# Altium integrated library Samtec 2 mm Pitch Terminal Strips.IntLib: 623 symbols (part 5 of 5) (continued)
## TW-36-02-F-D-190-SM-A (continued)
SMT Board Stacker, Vertical, -55 to 125 degC, 2 mm Pitch, 72-Pin, Male, RoHS; Manufacturer: Samtec; PartNumber: TW-36-02-F-D-190-SM-A; Pitch: 2 mm; DatasheetVersion: F-214; PackageVersion: CL, 3/1993; PackageReference: TW-36-02-X-D-190-SM-A; PackageDescription: High Temp 2mm SMT Board Stacking Terminal Strip ASM; Orientation: Vertical; RoHS: True; Temperature Range: -55 to 125 degC; Mounting Technology: Surface Mount; ComponentLink1Description: Manufacturer URL; ComponentLink1URL: http://www.samtec.com; ComponentLink2Description: Datasheet; ComponentLink2URL: http://d2a072wq521u33.cloudfront.net/catalog_english//TW_SM.PDF; ComponentLink3Description: Package Specification; ComponentLink3URL: http://www.samtec.com/documents/webfiles/cpdf/TW-XX-XX-XXX-X-XXX-SM-XXX-XX-MKT1.pdf
footprint SMTC-TW-36-02-X-D-190-SM-A (SMT Board Stacking Terminal Strip ASM, 2x36 Pins, Vertical, 2mm Pitch, Male)
pins: 1, 2, 3, 4, 5, 6, 7, 8, 9, 10, 11, 12, 13, 14, 15, 16, 17, 18, 19, 20, 21, 22, 23, 24, 25, 26, 27, 28, 29, 30, 31, 32, 33, 34, 35, 36, 37, 38, 39, 40, 41, 42, 43, 44, 45, 46, 47, 48, 49, 50, 51, 52, 53, 54, 55, 56, 57, 58, 59, 60, 61, 62, 63, 64, 65, 66, 67, 68, 69, 70, 71, 72

## TW-36-02-L-D-190-SM-A
designator ?
SMT Board Stacker, Vertical, -55 to 125 degC, 2 mm Pitch, 72-Pin, Male, RoHS; Manufacturer: Samtec; PartNumber: TW-36-02-L-D-190-SM-A; Pitch: 2 mm; DatasheetVersion: F-214; PackageVersion: CL, 3/1993; PackageReference: TW-36-02-X-D-190-SM-A; PackageDescription: High Temp 2mm SMT Board Stacking Terminal Strip ASM; Orientation: Vertical; RoHS: True; Temperature Range: -55 to 125 degC; Mounting Technology: Surface Mount; ComponentLink1Description: Manufacturer URL; ComponentLink1URL: http://www.samtec.com; ComponentLink2Description: Datasheet; ComponentLink2URL: http://d2a072wq521u33.cloudfront.net/catalog_english//TW_SM.PDF; ComponentLink3Description: Package Specification; ComponentLink3URL: http://www.samtec.com/documents/webfiles/cpdf/TW-XX-XX-XXX-X-XXX-SM-XXX-XX-MKT1.pdf
footprint SMTC-TW-36-02-X-D-190-SM-A (SMT Board Stacking Terminal Strip ASM, 2x36 Pins, Vertical, 2mm Pitch, Male)
pins: 1, 2, 3, 4, 5, 6, 7, 8, 9, 10, 11, 12, 13, 14, 15, 16, 17, 18, 19, 20, 21, 22, 23, 24, 25, 26, 27, 28, 29, 30, 31, 32, 33, 34, 35, 36, 37, 38, 39, 40, 41, 42, 43, 44, 45, 46, 47, 48, 49, 50, 51, 52, 53, 54, 55, 56, 57, 58, 59, 60, 61, 62, 63, 64, 65, 66, 67, 68, 69, 70, 71, 72

## TW-36-02-T-D-190-SM-A
designator ?
SMT Board Stacker, Vertical, -55 to 105 degC, 2 mm Pitch, 72-Pin, Male, RoHS; Manufacturer: Samtec; PartNumber: TW-36-02-T-D-190-SM-A; Pitch: 2 mm; DatasheetVersion: F-214; PackageVersion: CL, 3/1993; PackageReference: TW-36-02-X-D-190-SM-A; PackageDescription: High Temp 2mm SMT Board Stacking Terminal Strip ASM; Orientation: Vertical; RoHS: True; Temperature Range: -55 to 105 degC; Mounting Technology: Surface Mount; ComponentLink1Description: Manufacturer URL; ComponentLink1URL: http://www.samtec.com; ComponentLink2Description: Datasheet; ComponentLink2URL: http://d2a072wq521u33.cloudfront.net/catalog_english//TW_SM.PDF; ComponentLink3Description: Package Specification; ComponentLink3URL: http://www.samtec.com/documents/webfiles/cpdf/TW-XX-XX-XXX-X-XXX-SM-XXX-XX-MKT1.pdf
footprint SMTC-TW-36-02-X-D-190-SM-A (SMT Board Stacking Terminal Strip ASM, 2x36 Pins, Vertical, 2mm Pitch, Male)
pins: 1, 2, 3, 4, 5, 6, 7, 8, 9, 10, 11, 12, 13, 14, 15, 16, 17, 18, 19, 20, 21, 22, 23, 24, 25, 26, 27, 28, 29, 30, 31, 32, 33, 34, 35, 36, 37, 38, 39, 40, 41, 42, 43, 44, 45, 46, 47, 48, 49, 50, 51, 52, 53, 54, 55, 56, 57, 58, 59, 60, 61, 62, 63, 64, 65, 66, 67, 68, 69, 70, 71, 72

## TW-50-12-F-D-294-100
designator P?
Through-Hole Board Stacker, Vertical, -55 to 125 degC, 2 mm Pitch, 100-Pin, Male, RoHS; Manufacturer: Samtec; PartNumber: TW-50-12-F-D-294-100; Pitch: 2 mm; DatasheetVersion: F-214; PackageVersion: BF, 6/1998; PackageReference: TW-50-12-X-D-294-100; PackageDescription: High Temp 2mm Terminal Strip(Board Stacking); Orientation: Vertical; RoHS: True; Temperature Range: -55 to 125 degC; Mounting Technology: Through-hole; ComponentLink1Description: Manufacturer URL; ComponentLink1URL: http://www.samtec.com; ComponentLink2Description: Datasheet; ComponentLink2URL: http://d2a072wq521u33.cloudfront.net/catalog_english//TW_TH.PDF; ComponentLink3Description: Package Specification; ComponentLink3URL: http://www.samtec.com/documents/webfiles/cpdf/TW-XX-XX-X-X-XXX-XXX-XXX-XX-MKT2.pdf
footprint SMTC-TW-50-12-X-D-294-100 (Terminal Strip, 2x50 Pins, Vertical, 2mm Pitch, Male)
pins: 1, 2, 3, 4, 5, 6, 7, 8, 9, 10, 11, 12, 13, 14, 15, 16, 17, 18, 19, 20, 21, 22, 23, 24, 25, 26, 27, 28, 29, 30, 31, 32, 33, 34, 35, 36, 37, 38, 39, 40, 41, 42, 43, 44, 45, 46, 47, 48, 49, 50, 51, 52, 53, 54, 55, 56, 57, 58, 59, 60, 61, 62, 63, 64, 65, 66, 67, 68, 69, 70, 71, 72, 73, 74, 75, 76, 77, 78, 79, 80, 81, 82, 83, 84, 85, 86, 87, 88, 89, 90, 91, 92, 93, 94, 95, 96, 97, 98, 99, 100

## TW-50-12-L-D-294-100
designator P?
Through-Hole Board Stacker, Vertical, -55 to 125 degC, 2 mm Pitch, 100-Pin, Male, RoHS; Manufacturer: Samtec; PartNumber: TW-50-12-L-D-294-100; Pitch: 2 mm; DatasheetVersion: F-214; PackageVersion: BF, 6/1998; PackageReference: TW-50-12-X-D-294-100; PackageDescription: High Temp 2mm Terminal Strip(Board Stacking); Orientation: Vertical; RoHS: True; Temperature Range: -55 to 125 degC; Mounting Technology: Through-hole; ComponentLink1Description: Manufacturer URL; ComponentLink1URL: http://www.samtec.com; ComponentLink2Description: Datasheet; ComponentLink2URL: http://d2a072wq521u33.cloudfront.net/catalog_english//TW_TH.PDF; ComponentLink3Description: Package Specification; ComponentLink3URL: http://www.samtec.com/documents/webfiles/cpdf/TW-XX-XX-X-X-XXX-XXX-XXX-XX-MKT2.pdf
footprint SMTC-TW-50-12-X-D-294-100 (Terminal Strip, 2x50 Pins, Vertical, 2mm Pitch, Male)
pins: 1, 2, 3, 4, 5, 6, 7, 8, 9, 10, 11, 12, 13, 14, 15, 16, 17, 18, 19, 20, 21, 22, 23, 24, 25, 26, 27, 28, 29, 30, 31, 32, 33, 34, 35, 36, 37, 38, 39, 40, 41, 42, 43, 44, 45, 46, 47, 48, 49, 50, 51, 52, 53, 54, 55, 56, 57, 58, 59, 60, 61, 62, 63, 64, 65, 66, 67, 68, 69, 70, 71, 72, 73, 74, 75, 76, 77, 78, 79, 80, 81, 82, 83, 84, 85, 86, 87, 88, 89, 90, 91, 92, 93, 94, 95, 96, 97, 98, 99, 100

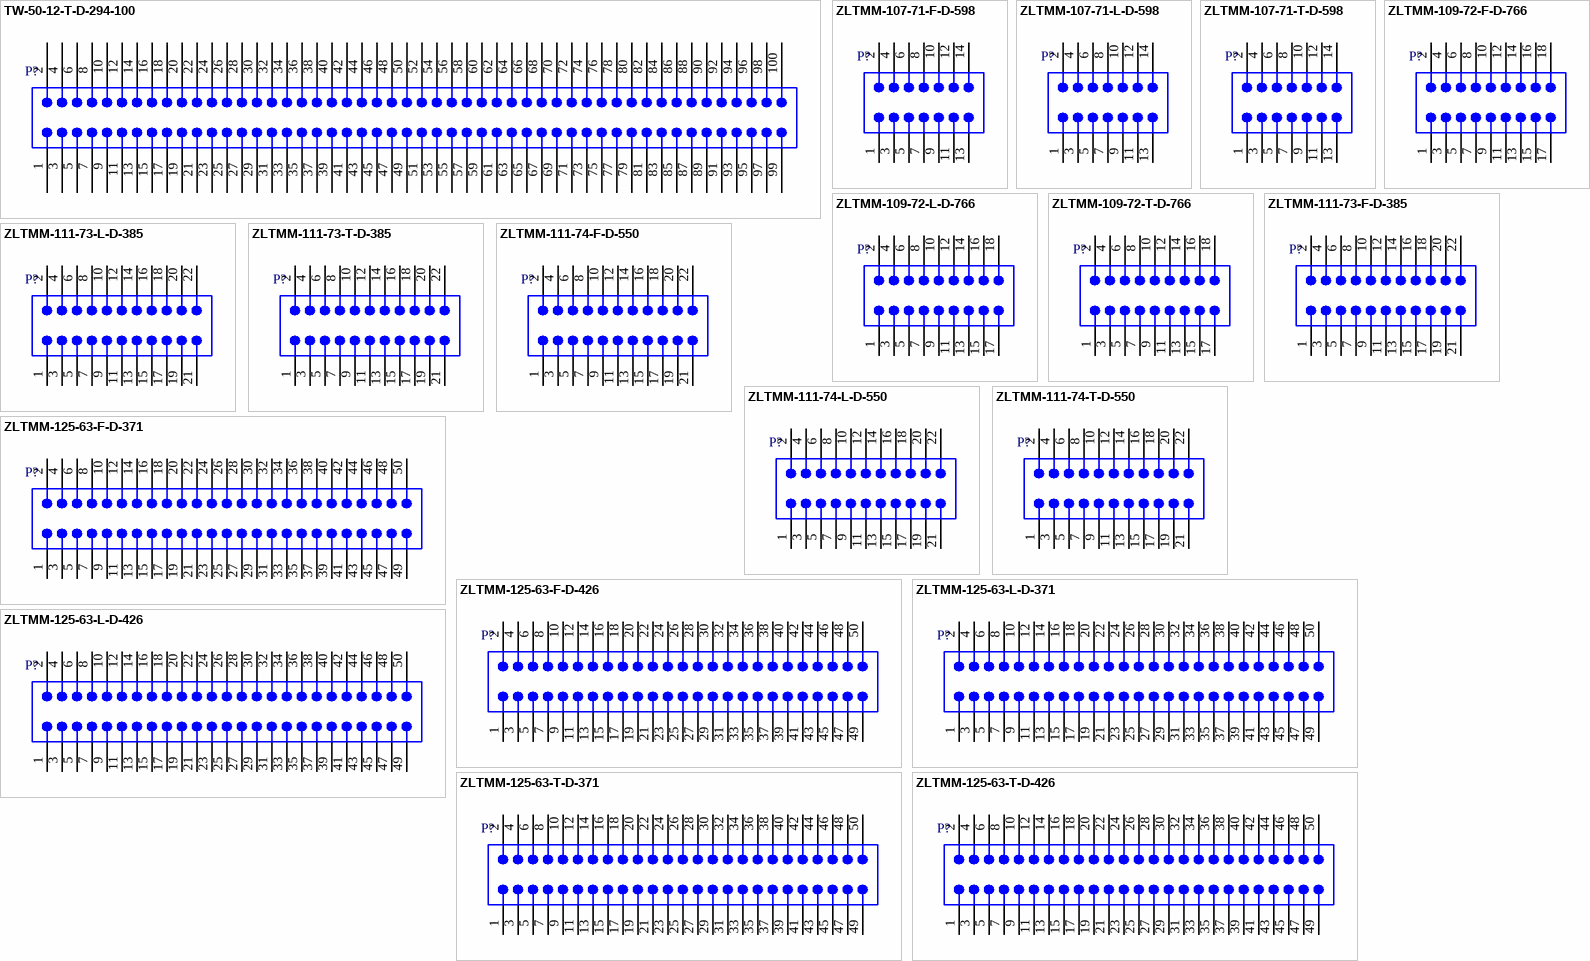
[diagram p17: symbols TW-50-12-T-D-294-100 to ZLTMM-125-63-T-D-426]

## TW-50-12-T-D-294-100
designator P?
Through-Hole Board Stacker, Vertical, -55 to 105 degC, 2 mm Pitch, 100-Pin, Male, RoHS; Manufacturer: Samtec; PartNumber: TW-50-12-T-D-294-100; Pitch: 2 mm; DatasheetVersion: F-214; PackageVersion: BF, 6/1998; PackageReference: TW-50-12-X-D-294-100; PackageDescription: High Temp 2mm Terminal Strip(Board Stacking); Orientation: Vertical; RoHS: True; Temperature Range: -55 to 105 degC; Mounting Technology: Through-hole; ComponentLink1Description: Manufacturer URL; ComponentLink1URL: http://www.samtec.com; ComponentLink2Description: Datasheet; ComponentLink2URL: http://d2a072wq521u33.cloudfront.net/catalog_english//TW_TH.PDF; ComponentLink3Description: Package Specification; ComponentLink3URL: http://www.samtec.com/documents/webfiles/cpdf/TW-XX-XX-X-X-XXX-XXX-XXX-XX-MKT2.pdf
footprint SMTC-TW-50-12-X-D-294-100 (Terminal Strip, 2x50 Pins, Vertical, 2mm Pitch, Male)
pins: 1, 2, 3, 4, 5, 6, 7, 8, 9, 10, 11, 12, 13, 14, 15, 16, 17, 18, 19, 20, 21, 22, 23, 24, 25, 26, 27, 28, 29, 30, 31, 32, 33, 34, 35, 36, 37, 38, 39, 40, 41, 42, 43, 44, 45, 46, 47, 48, 49, 50, 51, 52, 53, 54, 55, 56, 57, 58, 59, 60, 61, 62, 63, 64, 65, 66, 67, 68, 69, 70, 71, 72, 73, 74, 75, 76, 77, 78, 79, 80, 81, 82, 83, 84, 85, 86, 87, 88, 89, 90, 91, 92, 93, 94, 95, 96, 97, 98, 99, 100

## ZLTMM-107-71-F-D-598
designator P?
Shrouded Header & Stacker, Through-Hole, Vertical, -55 to 125 degC, 2 mm Pitch, 14-Pin, Male, RoHS; Manufacturer: Samtec; PartNumber: ZLTMM-107-71-F-D-598; Pitch: 2 mm; DatasheetVersion: F-214; PackageVersion: T, 7/1992; PackageReference: ZLTMM-107-71-X-D-598; PackageDescription: ZLTMM Assembly; Orientation: Vertical; RoHS: True; Temperature Range: -55 to 125 degC; Mounting Technology: Through-hole; ComponentLink1Description: Manufacturer URL; ComponentLink1URL: http://www.samtec.com; ComponentLink2Description: Datasheet; ComponentLink2URL: http://d2a072wq521u33.cloudfront.net/catalog_english//ZLTMM_TH.PDF; ComponentLink3Description: Package Specification; ComponentLink3URL: http://www.samtec.com/documents/webfiles/cpdf/ZLTMM-1XX-XX-XX-D-XXX-XX-ASM-mktg.pdf
footprint SMTC-ZLTMM-107-71-X-D-598 (Shrouded Header & Stacker, 2x7 Pins, Vertical, 2mm Pitch, Male)
pins: 1, 2, 3, 4, 5, 6, 7, 8, 9, 10, 11, 12, 13, 14

## ZLTMM-107-71-L-D-598
designator P?
Shrouded Header & Stacker, Through-Hole, Vertical, -55 to 125 degC, 2 mm Pitch, 14-Pin, Male, RoHS; Manufacturer: Samtec; PartNumber: ZLTMM-107-71-L-D-598; Pitch: 2 mm; DatasheetVersion: F-214; PackageVersion: T, 7/1992; PackageReference: ZLTMM-107-71-X-D-598; PackageDescription: ZLTMM Assembly; Orientation: Vertical; RoHS: True; Temperature Range: -55 to 125 degC; Mounting Technology: Through-hole; ComponentLink1Description: Manufacturer URL; ComponentLink1URL: http://www.samtec.com; ComponentLink2Description: Datasheet; ComponentLink2URL: http://d2a072wq521u33.cloudfront.net/catalog_english//ZLTMM_TH.PDF; ComponentLink3Description: Package Specification; ComponentLink3URL: http://www.samtec.com/documents/webfiles/cpdf/ZLTMM-1XX-XX-XX-D-XXX-XX-ASM-mktg.pdf
footprint SMTC-ZLTMM-107-71-X-D-598 (Shrouded Header & Stacker, 2x7 Pins, Vertical, 2mm Pitch, Male)
pins: 1, 2, 3, 4, 5, 6, 7, 8, 9, 10, 11, 12, 13, 14

## ZLTMM-107-71-T-D-598
designator P?
Shrouded Header & Stacker, Through-Hole, Vertical, -55 to 105 degC, 2 mm Pitch, 14-Pin, Male, RoHS; Manufacturer: Samtec; PartNumber: ZLTMM-107-71-T-D-598; Pitch: 2 mm; DatasheetVersion: F-214; PackageVersion: T, 7/1992; PackageReference: ZLTMM-107-71-X-D-598; PackageDescription: ZLTMM Assembly; Orientation: Vertical; RoHS: True; Temperature Range: -55 to 105 degC; Mounting Technology: Through-hole; ComponentLink1Description: Manufacturer URL; ComponentLink1URL: http://www.samtec.com; ComponentLink2Description: Datasheet; ComponentLink2URL: http://d2a072wq521u33.cloudfront.net/catalog_english//ZLTMM_TH.PDF; ComponentLink3Description: Package Specification; ComponentLink3URL: http://www.samtec.com/documents/webfiles/cpdf/ZLTMM-1XX-XX-XX-D-XXX-XX-ASM-mktg.pdf
footprint SMTC-ZLTMM-107-71-X-D-598 (Shrouded Header & Stacker, 2x7 Pins, Vertical, 2mm Pitch, Male)
pins: 1, 2, 3, 4, 5, 6, 7, 8, 9, 10, 11, 12, 13, 14

## ZLTMM-109-72-F-D-766
designator P?
Shrouded Header & Stacker, Through-Hole, Vertical, -55 to 125 degC, 2 mm Pitch, 18-Pin, Male, RoHS; Manufacturer: Samtec; PartNumber: ZLTMM-109-72-F-D-766; Pitch: 2 mm; DatasheetVersion: F-214; PackageVersion: T, 7/1992; PackageReference: ZLTMM-109-72-X-D-766; PackageDescription: ZLTMM Assembly; Orientation: Vertical; RoHS: True; Temperature Range: -55 to 125 degC; Mounting Technology: Through-hole; ComponentLink1Description: Manufacturer URL; ComponentLink1URL: http://www.samtec.com; ComponentLink2Description: Datasheet; ComponentLink2URL: http://d2a072wq521u33.cloudfront.net/catalog_english//ZLTMM_TH.PDF; ComponentLink3Description: Package Specification; ComponentLink3URL: http://www.samtec.com/documents/webfiles/cpdf/ZLTMM-1XX-XX-XX-D-XXX-XX-ASM-mktg.pdf
footprint SMTC-ZLTMM-109-72-X-D-766 (Shrouded Header & Stacker, 2x9 Pins, Vertical, 2mm Pitch, Male)
pins: 1, 2, 3, 4, 5, 6, 7, 8, 9, 10, 11, 12, 13, 14, 15, 16, 17, 18

## ZLTMM-109-72-L-D-766
designator P?
Shrouded Header & Stacker, Through-Hole, Vertical, -55 to 125 degC, 2 mm Pitch, 18-Pin, Male, RoHS; Manufacturer: Samtec; PartNumber: ZLTMM-109-72-L-D-766; Pitch: 2 mm; DatasheetVersion: F-214; PackageVersion: T, 7/1992; PackageReference: ZLTMM-109-72-X-D-766; PackageDescription: ZLTMM Assembly; Orientation: Vertical; RoHS: True; Temperature Range: -55 to 125 degC; Mounting Technology: Through-hole; ComponentLink1Description: Manufacturer URL; ComponentLink1URL: http://www.samtec.com; ComponentLink2Description: Datasheet; ComponentLink2URL: http://d2a072wq521u33.cloudfront.net/catalog_english//ZLTMM_TH.PDF; ComponentLink3Description: Package Specification; ComponentLink3URL: http://www.samtec.com/documents/webfiles/cpdf/ZLTMM-1XX-XX-XX-D-XXX-XX-ASM-mktg.pdf
footprint SMTC-ZLTMM-109-72-X-D-766 (Shrouded Header & Stacker, 2x9 Pins, Vertical, 2mm Pitch, Male)
pins: 1, 2, 3, 4, 5, 6, 7, 8, 9, 10, 11, 12, 13, 14, 15, 16, 17, 18

## ZLTMM-109-72-T-D-766
designator P?
Shrouded Header & Stacker, Through-Hole, Vertical, -55 to 105 degC, 2 mm Pitch, 18-Pin, Male, RoHS; Manufacturer: Samtec; PartNumber: ZLTMM-109-72-T-D-766; Pitch: 2 mm; DatasheetVersion: F-214; PackageVersion: T, 7/1992; PackageReference: ZLTMM-109-72-X-D-766; PackageDescription: ZLTMM Assembly; Orientation: Vertical; RoHS: True; Temperature Range: -55 to 105 degC; Mounting Technology: Through-hole; ComponentLink1Description: Manufacturer URL; ComponentLink1URL: http://www.samtec.com; ComponentLink2Description: Datasheet; ComponentLink2URL: http://d2a072wq521u33.cloudfront.net/catalog_english//ZLTMM_TH.PDF; ComponentLink3Description: Package Specification; ComponentLink3URL: http://www.samtec.com/documents/webfiles/cpdf/ZLTMM-1XX-XX-XX-D-XXX-XX-ASM-mktg.pdf
footprint SMTC-ZLTMM-109-72-X-D-766 (Shrouded Header & Stacker, 2x9 Pins, Vertical, 2mm Pitch, Male)
pins: 1, 2, 3, 4, 5, 6, 7, 8, 9, 10, 11, 12, 13, 14, 15, 16, 17, 18

## ZLTMM-111-73-F-D-385
designator P?
Shrouded Header & Stacker, Through-Hole, Vertical, -55 to 125 degC, 2 mm Pitch, 22-Pin, Male, RoHS; Manufacturer: Samtec; PartNumber: ZLTMM-111-73-F-D-385; Pitch: 2 mm; DatasheetVersion: F-214; PackageVersion: T, 7/1992; PackageReference: ZLTMM-111-73-X-D-385; PackageDescription: ZLTMM Assembly; Orientation: Vertical; RoHS: True; Temperature Range: -55 to 125 degC; Mounting Technology: Through-hole; ComponentLink1Description: Manufacturer URL; ComponentLink1URL: http://www.samtec.com; ComponentLink2Description: Datasheet; ComponentLink2URL: http://d2a072wq521u33.cloudfront.net/catalog_english//ZLTMM_TH.PDF; ComponentLink3Description: Package Specification; ComponentLink3URL: http://www.samtec.com/documents/webfiles/cpdf/ZLTMM-1XX-XX-XX-D-XXX-XX-ASM-mktg.pdf
footprint SMTC-ZLTMM-111-73-X-D-385 (Shrouded Header & Stacker, 2x11 Pins, Vertical, 2mm Pitch, Male)
pins: 1, 2, 3, 4, 5, 6, 7, 8, 9, 10, 11, 12, 13, 14, 15, 16, 17, 18, 19, 20, 21, 22

## ZLTMM-111-73-L-D-385
designator P?
Shrouded Header & Stacker, Through-Hole, Vertical, -55 to 125 degC, 2 mm Pitch, 22-Pin, Male, RoHS; Manufacturer: Samtec; PartNumber: ZLTMM-111-73-L-D-385; Pitch: 2 mm; DatasheetVersion: F-214; PackageVersion: T, 7/1992; PackageReference: ZLTMM-111-73-X-D-385; PackageDescription: ZLTMM Assembly; Orientation: Vertical; RoHS: True; Temperature Range: -55 to 125 degC; Mounting Technology: Through-hole; ComponentLink1Description: Manufacturer URL; ComponentLink1URL: http://www.samtec.com; ComponentLink2Description: Datasheet; ComponentLink2URL: http://d2a072wq521u33.cloudfront.net/catalog_english//ZLTMM_TH.PDF; ComponentLink3Description: Package Specification; ComponentLink3URL: http://www.samtec.com/documents/webfiles/cpdf/ZLTMM-1XX-XX-XX-D-XXX-XX-ASM-mktg.pdf
footprint SMTC-ZLTMM-111-73-X-D-385 (Shrouded Header & Stacker, 2x11 Pins, Vertical, 2mm Pitch, Male)
pins: 1, 2, 3, 4, 5, 6, 7, 8, 9, 10, 11, 12, 13, 14, 15, 16, 17, 18, 19, 20, 21, 22

## ZLTMM-111-73-T-D-385
designator P?
Shrouded Header & Stacker, Through-Hole, Vertical, -55 to 105 degC, 2 mm Pitch, 22-Pin, Male, RoHS; Manufacturer: Samtec; PartNumber: ZLTMM-111-73-T-D-385; Pitch: 2 mm; DatasheetVersion: F-214; PackageVersion: T, 7/1992; PackageReference: ZLTMM-111-73-X-D-385; PackageDescription: ZLTMM Assembly; Orientation: Vertical; RoHS: True; Temperature Range: -55 to 105 degC; Mounting Technology: Through-hole; ComponentLink1Description: Manufacturer URL; ComponentLink1URL: http://www.samtec.com; ComponentLink2Description: Datasheet; ComponentLink2URL: http://d2a072wq521u33.cloudfront.net/catalog_english//ZLTMM_TH.PDF; ComponentLink3Description: Package Specification; ComponentLink3URL: http://www.samtec.com/documents/webfiles/cpdf/ZLTMM-1XX-XX-XX-D-XXX-XX-ASM-mktg.pdf
footprint SMTC-ZLTMM-111-73-X-D-385 (Shrouded Header & Stacker, 2x11 Pins, Vertical, 2mm Pitch, Male)
pins: 1, 2, 3, 4, 5, 6, 7, 8, 9, 10, 11, 12, 13, 14, 15, 16, 17, 18, 19, 20, 21, 22

## ZLTMM-111-74-F-D-550
designator P?
Shrouded Header & Stacker, Through-Hole, Vertical, -55 to 125 degC, 2 mm Pitch, 22-Pin, Male, RoHS; Manufacturer: Samtec; PartNumber: ZLTMM-111-74-F-D-550; Pitch: 2 mm; DatasheetVersion: F-214; PackageVersion: T, 7/1992; PackageReference: ZLTMM-111-74-X-D-550; PackageDescription: ZLTMM Assembly; Orientation: Vertical; RoHS: True; Temperature Range: -55 to 125 degC; Mounting Technology: Through-hole; ComponentLink1Description: Manufacturer URL; ComponentLink1URL: http://www.samtec.com; ComponentLink2Description: Datasheet; ComponentLink2URL: http://d2a072wq521u33.cloudfront.net/catalog_english//ZLTMM_TH.PDF; ComponentLink3Description: Package Specification; ComponentLink3URL: http://www.samtec.com/documents/webfiles/cpdf/ZLTMM-1XX-XX-XX-D-XXX-XX-ASM-mktg.pdf
footprint SMTC-ZLTMM-111-74-X-D-550 (Shrouded Header & Stacker, 2x11 Pins, Vertical, 2mm Pitch, Male)
pins: 1, 2, 3, 4, 5, 6, 7, 8, 9, 10, 11, 12, 13, 14, 15, 16, 17, 18, 19, 20, 21, 22

## ZLTMM-111-74-L-D-550
designator P?
Shrouded Header & Stacker, Through-Hole, Vertical, -55 to 125 degC, 2 mm Pitch, 22-Pin, Male, RoHS; Manufacturer: Samtec; PartNumber: ZLTMM-111-74-L-D-550; Pitch: 2 mm; DatasheetVersion: F-214; PackageVersion: T, 7/1992; PackageReference: ZLTMM-111-74-X-D-550; PackageDescription: ZLTMM Assembly; Orientation: Vertical; RoHS: True; Temperature Range: -55 to 125 degC; Mounting Technology: Through-hole; ComponentLink1Description: Manufacturer URL; ComponentLink1URL: http://www.samtec.com; ComponentLink2Description: Datasheet; ComponentLink2URL: http://d2a072wq521u33.cloudfront.net/catalog_english//ZLTMM_TH.PDF; ComponentLink3Description: Package Specification; ComponentLink3URL: http://www.samtec.com/documents/webfiles/cpdf/ZLTMM-1XX-XX-XX-D-XXX-XX-ASM-mktg.pdf
footprint SMTC-ZLTMM-111-74-X-D-550 (Shrouded Header & Stacker, 2x11 Pins, Vertical, 2mm Pitch, Male)
pins: 1, 2, 3, 4, 5, 6, 7, 8, 9, 10, 11, 12, 13, 14, 15, 16, 17, 18, 19, 20, 21, 22

## ZLTMM-111-74-T-D-550
designator P?
Shrouded Header & Stacker, Through-Hole, Vertical, -55 to 105 degC, 2 mm Pitch, 22-Pin, Male, RoHS; Manufacturer: Samtec; PartNumber: ZLTMM-111-74-T-D-550; Pitch: 2 mm; DatasheetVersion: F-214; PackageVersion: T, 7/1992; PackageReference: ZLTMM-111-74-X-D-550; PackageDescription: ZLTMM Assembly; Orientation: Vertical; RoHS: True; Temperature Range: -55 to 105 degC; Mounting Technology: Through-hole; ComponentLink1Description: Manufacturer URL; ComponentLink1URL: http://www.samtec.com; ComponentLink2Description: Datasheet; ComponentLink2URL: http://d2a072wq521u33.cloudfront.net/catalog_english//ZLTMM_TH.PDF; ComponentLink3Description: Package Specification; ComponentLink3URL: http://www.samtec.com/documents/webfiles/cpdf/ZLTMM-1XX-XX-XX-D-XXX-XX-ASM-mktg.pdf
footprint SMTC-ZLTMM-111-74-X-D-550 (Shrouded Header & Stacker, 2x11 Pins, Vertical, 2mm Pitch, Male)
pins: 1, 2, 3, 4, 5, 6, 7, 8, 9, 10, 11, 12, 13, 14, 15, 16, 17, 18, 19, 20, 21, 22

## ZLTMM-125-63-F-D-371
designator P?
Shrouded Header & Stacker, Through-Hole, Vertical, -55 to 125 degC, 2 mm Pitch, 50-Pin, Male, RoHS; Manufacturer: Samtec; PartNumber: ZLTMM-125-63-F-D-371; Pitch: 2 mm; DatasheetVersion: F-214; PackageVersion: T, 7/1992; PackageReference: ZLTMM-125-63-X-D-371; PackageDescription: ZLTMM Assembly; Orientation: Vertical; RoHS: True; Temperature Range: -55 to 125 degC; Mounting Technology: Through-hole; ComponentLink1Description: Manufacturer URL; ComponentLink1URL: http://www.samtec.com; ComponentLink2Description: Datasheet; ComponentLink2URL: http://d2a072wq521u33.cloudfront.net/catalog_english//ZLTMM_TH.PDF; ComponentLink3Description: Package Specification; ComponentLink3URL: http://www.samtec.com/documents/webfiles/cpdf/ZLTMM-1XX-XX-XX-D-XXX-XX-ASM-mktg.pdf
footprint SMTC-ZLTMM-125-63-X-D-371 (Shrouded Header & Stacker, 2x25 Pins, Vertical, 2mm Pitch, Male)
pins: 1, 2, 3, 4, 5, 6, 7, 8, 9, 10, 11, 12, 13, 14, 15, 16, 17, 18, 19, 20, 21, 22, 23, 24, 25, 26, 27, 28, 29, 30, 31, 32, 33, 34, 35, 36, 37, 38, 39, 40, 41, 42, 43, 44, 45, 46, 47, 48, 49, 50

## ZLTMM-125-63-F-D-426
designator P?
Shrouded Header & Stacker, Through-Hole, Vertical, -55 to 125 degC, 2 mm Pitch, 50-Pin, Male, RoHS; Manufacturer: Samtec; PartNumber: ZLTMM-125-63-F-D-426; Pitch: 2 mm; DatasheetVersion: F-214; PackageVersion: T, 7/1992; PackageReference: ZLTMM-125-63-X-D-426; PackageDescription: ZLTMM Assembly; Orientation: Vertical; RoHS: True; Temperature Range: -55 to 125 degC; Mounting Technology: Through-hole; ComponentLink1Description: Manufacturer URL; ComponentLink1URL: http://www.samtec.com; ComponentLink2Description: Datasheet; ComponentLink2URL: http://d2a072wq521u33.cloudfront.net/catalog_english//ZLTMM_TH.PDF; ComponentLink3Description: Package Specification; ComponentLink3URL: http://www.samtec.com/documents/webfiles/cpdf/ZLTMM-1XX-XX-XX-D-XXX-XX-ASM-mktg.pdf
footprint SMTC-ZLTMM-125-63-X-D-426 (Shrouded Header & Stacker, 2x25 Pins, Vertical, 2mm Pitch, Male)
pins: 1, 2, 3, 4, 5, 6, 7, 8, 9, 10, 11, 12, 13, 14, 15, 16, 17, 18, 19, 20, 21, 22, 23, 24, 25, 26, 27, 28, 29, 30, 31, 32, 33, 34, 35, 36, 37, 38, 39, 40, 41, 42, 43, 44, 45, 46, 47, 48, 49, 50

## ZLTMM-125-63-L-D-371
designator P?
Shrouded Header & Stacker, Through-Hole, Vertical, -55 to 125 degC, 2 mm Pitch, 50-Pin, Male, RoHS; Manufacturer: Samtec; PartNumber: ZLTMM-125-63-L-D-371; Pitch: 2 mm; DatasheetVersion: F-214; PackageVersion: T, 7/1992; PackageReference: ZLTMM-125-63-X-D-371; PackageDescription: ZLTMM Assembly; Orientation: Vertical; RoHS: True; Temperature Range: -55 to 125 degC; Mounting Technology: Through-hole; ComponentLink1Description: Manufacturer URL; ComponentLink1URL: http://www.samtec.com; ComponentLink2Description: Datasheet; ComponentLink2URL: http://d2a072wq521u33.cloudfront.net/catalog_english//ZLTMM_TH.PDF; ComponentLink3Description: Package Specification; ComponentLink3URL: http://www.samtec.com/documents/webfiles/cpdf/ZLTMM-1XX-XX-XX-D-XXX-XX-ASM-mktg.pdf
footprint SMTC-ZLTMM-125-63-X-D-371 (Shrouded Header & Stacker, 2x25 Pins, Vertical, 2mm Pitch, Male)
pins: 1, 2, 3, 4, 5, 6, 7, 8, 9, 10, 11, 12, 13, 14, 15, 16, 17, 18, 19, 20, 21, 22, 23, 24, 25, 26, 27, 28, 29, 30, 31, 32, 33, 34, 35, 36, 37, 38, 39, 40, 41, 42, 43, 44, 45, 46, 47, 48, 49, 50

## ZLTMM-125-63-L-D-426
designator P?
Shrouded Header & Stacker, Through-Hole, Vertical, -55 to 125 degC, 2 mm Pitch, 50-Pin, Male, RoHS; Manufacturer: Samtec; PartNumber: ZLTMM-125-63-L-D-426; Pitch: 2 mm; DatasheetVersion: F-214; PackageVersion: T, 7/1992; PackageReference: ZLTMM-125-63-X-D-426; PackageDescription: ZLTMM Assembly; Orientation: Vertical; RoHS: True; Temperature Range: -55 to 125 degC; Mounting Technology: Through-hole; ComponentLink1Description: Manufacturer URL; ComponentLink1URL: http://www.samtec.com; ComponentLink2Description: Datasheet; ComponentLink2URL: http://d2a072wq521u33.cloudfront.net/catalog_english//ZLTMM_TH.PDF; ComponentLink3Description: Package Specification; ComponentLink3URL: http://www.samtec.com/documents/webfiles/cpdf/ZLTMM-1XX-XX-XX-D-XXX-XX-ASM-mktg.pdf
footprint SMTC-ZLTMM-125-63-X-D-426 (Shrouded Header & Stacker, 2x25 Pins, Vertical, 2mm Pitch, Male)
pins: 1, 2, 3, 4, 5, 6, 7, 8, 9, 10, 11, 12, 13, 14, 15, 16, 17, 18, 19, 20, 21, 22, 23, 24, 25, 26, 27, 28, 29, 30, 31, 32, 33, 34, 35, 36, 37, 38, 39, 40, 41, 42, 43, 44, 45, 46, 47, 48, 49, 50

## ZLTMM-125-63-T-D-371
designator P?
Shrouded Header & Stacker, Through-Hole, Vertical, -55 to 105 degC, 2 mm Pitch, 50-Pin, Male, RoHS; Manufacturer: Samtec; PartNumber: ZLTMM-125-63-T-D-371; Pitch: 2 mm; DatasheetVersion: F-214; PackageVersion: T, 7/1992; PackageReference: ZLTMM-125-63-X-D-371; PackageDescription: ZLTMM Assembly; Orientation: Vertical; RoHS: True; Temperature Range: -55 to 105 degC; Mounting Technology: Through-hole; ComponentLink1Description: Manufacturer URL; ComponentLink1URL: http://www.samtec.com; ComponentLink2Description: Datasheet; ComponentLink2URL: http://d2a072wq521u33.cloudfront.net/catalog_english//ZLTMM_TH.PDF; ComponentLink3Description: Package Specification; ComponentLink3URL: http://www.samtec.com/documents/webfiles/cpdf/ZLTMM-1XX-XX-XX-D-XXX-XX-ASM-mktg.pdf
footprint SMTC-ZLTMM-125-63-X-D-371 (Shrouded Header & Stacker, 2x25 Pins, Vertical, 2mm Pitch, Male)
pins: 1, 2, 3, 4, 5, 6, 7, 8, 9, 10, 11, 12, 13, 14, 15, 16, 17, 18, 19, 20, 21, 22, 23, 24, 25, 26, 27, 28, 29, 30, 31, 32, 33, 34, 35, 36, 37, 38, 39, 40, 41, 42, 43, 44, 45, 46, 47, 48, 49, 50

## ZLTMM-125-63-T-D-426
designator P?
Shrouded Header & Stacker, Through-Hole, Vertical, -55 to 105 degC, 2 mm Pitch, 50-Pin, Male, RoHS; Manufacturer: Samtec; PartNumber: ZLTMM-125-63-T-D-426; Pitch: 2 mm; DatasheetVersion: F-214; PackageVersion: T, 7/1992; PackageReference: ZLTMM-125-63-X-D-426; PackageDescription: ZLTMM Assembly; Orientation: Vertical; RoHS: True; Temperature Range: -55 to 105 degC; Mounting Technology: Through-hole; ComponentLink1Description: Manufacturer URL; ComponentLink1URL: http://www.samtec.com; ComponentLink2Description: Datasheet; ComponentLink2URL: http://d2a072wq521u33.cloudfront.net/catalog_english//ZLTMM_TH.PDF; ComponentLink3Description: Package Specification; ComponentLink3URL: http://www.samtec.com/documents/webfiles/cpdf/ZLTMM-1XX-XX-XX-D-XXX-XX-ASM-mktg.pdf
footprint SMTC-ZLTMM-125-63-X-D-426 (Shrouded Header & Stacker, 2x25 Pins, Vertical, 2mm Pitch, Male)
pins: 1, 2, 3, 4, 5, 6, 7, 8, 9, 10, 11, 12, 13, 14, 15, 16, 17, 18, 19, 20, 21, 22, 23, 24, 25, 26, 27, 28, 29, 30, 31, 32, 33, 34, 35, 36, 37, 38, 39, 40, 41, 42, 43, 44, 45, 46, 47, 48, 49, 50